# Altium footprint library Miscellaneous THD.PcbLib: 216 footprints (part 4 of 15) (continued)
## FCT_FDT37SG2M [mm] "Dual Stacked  Right Angled D-SUB 37 Pins Female Connector, With Threaded Insert UNC 4-40, And PCB Mount Retention"
height 31.5
pads (78):
  round 3.9 hole 3.2: 75(-31.75,-3.06) 75(-31.75,4.89) 76(31.75,-3.06) 76(31.75,4.89)
  round 1.7 hole 1: L1(-24.84,1.91) L2(-22.1,1.91) L3(-19.33,1.91) L4(-16.56,1.91) L5(-13.82,1.91) L6(-11.05,1.91) L7(-8.28,1.91) L8(-5.54,1.91) L9(-2.773,1.91) L10(0,1.91) L11(2.77,1.91) L12(5.54,1.91) L13(8.28,1.91) L14(11.05,1.91) L15(13.82,1.91) L16(16.56,1.91) L17(19.33,1.91) L18(22.1,1.91) L19(24.84,1.91) L20(-23.47,4.75) L21(-20.7,4.75) L22(-17.96,4.75) L23(-15.19,4.75) L24(-12.42,4.75) L25(-9.68,4.75) L26(-6.91,4.75) L27(-4.14,4.75) L28(-1.4,4.75) L29(1.4,4.75) L30(4.14,4.75) L31(6.91,4.75) L32(9.68,4.75) L33(12.42,4.75) L34(15.19,4.75) L35(17.96,4.75) L36(20.7,4.75) L37(23.47,4.75) U1(-24.84,-4.75) U2(-22.1,-4.75) U3(-19.33,-4.75) U4(-16.56,-4.75) U5(-13.82,-4.75) U6(-11.05,-4.75) U7(-8.28,-4.75) U8(-5.54,-4.75) U9(-2.773,-4.75) U10(0,-4.75) U11(2.77,-4.75) U12(5.54,-4.75) U13(8.28,-4.75) U14(11.05,-4.75) U15(13.82,-4.75) U16(16.56,-4.75) U17(19.33,-4.75) U18(22.1,-4.75) U19(24.84,-4.75) U20(-23.47,-1.91) U21(-20.7,-1.91) U22(-17.96,-1.91) U23(-15.19,-1.91) U24(-12.42,-1.91) U25(-9.68,-1.91) U26(-6.91,-1.91) U27(-4.14,-1.91) U28(-1.4,-1.91) U29(1.4,-1.91) U30(4.14,-1.91) U31(6.91,-1.91) U32(9.68,-1.91) U33(12.42,-1.91) U34(15.19,-1.91) U35(17.96,-1.91) U36(20.7,-1.91) U37(23.47,-1.91)
Top Overlay:
  circle w0.5: c-24.845,-7.955 r0.25
  lines w0.2: -34.65,9.99 34.65,9.99 ; -34.65,12.24 34.65,12.24 ; -34.55,7.99 34.55,7.99 ; -29.05,-6.96 -29.05,9.99 ; -27.949,12.84 ccw(c-27.949,13.34) -27.449,13.34 -27.449,18.265 cw(c-26.574,18.265) -26.574,19.14 26.572,19.14 cw(c26.572,18.265) 27.447,18.265 27.447,13.34 ccw(c27.947,13.34) 27.947,12.84 ; -3.14,-6.96 -34.65,-6.96 -34.65,12.84 34.65,12.84 34.65,-6.96 3.14,-6.96 ; 29.05,-6.96 29.05,9.99
  text "1" at -27.349,-5.287 h1.2
  text "1" at -27.349,1.373 h1.2
  text "37" at 25.016,4.238 h1.2
  text "37" at 25.016,-2.422 h1.2
  text "20" at -27.626,4.188 h1.2
  text "20" at -27.626,-2.472 h1.2
  text "19" at 26.386,-5.262 h1.2
  text "19" at 26.386,1.398 h1.2
  text "UPPER" at -2.21,-7.485 h1
  text "LOWER" at -2.425,6.335 h1
Mechanical 8:
  drawing of 316 lines, arcs and shapes, not listed
Mechanical 14:
  lines w0.1: -34.65,9.99 34.65,9.99 ; -34.65,12.24 34.65,12.24 ; -34.55,7.99 34.55,7.99 ; -29.05,-6.96 -29.05,7.99 -29.05,9.99 ; -27.949,12.84 ccw(c-27.949,13.34) -27.449,13.34 -27.449,18.265 cw(c-26.574,18.265) -26.574,19.14 26.572,19.14 cw(c26.572,18.265) 27.447,18.265 27.447,13.34 ccw(c27.947,13.34) 27.947,12.84 ; 3.14,-6.96 34.65,-6.96 34.65,12.84 -34.65,12.84 -34.65,-6.96 ; 29.05,-6.96 29.05,7.99 29.05,9.99 ; 30.684,5.09 30.684,-3.26 32.816,-3.26 32.816,5.09 ; 30.72,5.09 32.828,5.09 ; -34.65,-6.96 -3.14,-6.96 -34.65,-6.96 ; -32.816,-3.26 -32.816,5.09 -30.684,5.09 -30.684,-3.26 -32.816,-3.26
  text "1" at -27.349,-5.287 h1.2
  text "1" at -27.349,1.373 h1.2
  text "37" at 25.016,4.238 h1.2
  text "37" at 25.016,-2.422 h1.2
  text "20" at -27.626,4.188 h1.2
  text "20" at -27.626,-2.472 h1.2
  text "19" at 26.386,-5.262 h1.2
  text "19" at 26.386,1.398 h1.2
  text "UPPER" at -2.21,-7.485 h1
  text "LOWER" at -2.425,6.335 h1
3D body "FCT_FDT37SG2M.stp": height 31.7, standoff -3.5, extent -34.65,-6.96 34.65,19.14

## FISCHER_DBPC 102 A051-130 [mm] "Panel Rear Mounted Receptacle, 2 Contacts, Right-Angled for PCB, Keying Code 1, DBPC 102 Series"
height 12
pads (2):
  round 1.5 hole 0.8: 1(0,1.27) 2(0,-1.27)
Top Overlay:
  lines w0.2: -5,-12.87 5,-12.87 ; -4.5,-19.57 -4.5,-20.17 -4.1,-20.57 4.1,-20.57 4.5,-20.17 4.5,-19.57 ; -4.5,-16.57 -4.5,-14.07 ; -4.5,-12.57 -4.5,-6.57 ; -3.723,-16.57 -3.824,-16.77 ; -3.366,-16.57 -3.366,-19.312 ; -2.75,-6.07 -2.75,-4.77 2.375,-4.77 2.375,-6.07 ; -2.375,-6.07 -2.375,-4.77 ; -1.991,-16.57 -2.092,-16.77 ; -0.6,-19.57 ccw(c0,-19.57) 0.6,-19.57 ; -0.3,-4.77 -0.3,-2.328 ; -0.3,-2.985 cw(c0,0) 0.3,-2.985 ; 0.3,-4.77 0.3,-2.328 ; 1.991,-16.57 2.092,-16.77 ; 3.366,-16.57 3.366,-19.312 ; 3.723,-16.57 3.824,-16.77 ; 4.5,-16.57 4.5,-14.07 ; 4.5,-12.57 4.5,-6.57 ; -5.916,-17.751 -5,-19.312 -5,-19.483 -4.95,-19.57 4.95,-19.57 5,-19.483 5,-19.312 5.916,-17.751 ; -5.916,-17.751 -5.916,-16.77 ; -5.916,-17.751 -3.824,-17.751 ; -5.916,-16.77 -5.713,-16.57 5.713,-16.57 5.916,-16.77 ; -5.916,-16.77 -3.824,-16.77 ; -4.5,-6.57 -4,-6.07 4,-6.07 4.5,-6.57 ; -4.5,-6.57 4.5,-6.57 ; -3.824,-17.751 -3.824,-16.77 ; -3.824,-17.751 -3.366,-19.312 ; -3.366,-19.312 ccw(c-2.5,-17.211) -1.634,-19.312 -2.092,-17.751 ; -2.092,-17.751 -2.092,-16.77 ; -2.092,-17.751 2.092,-17.751 ; -2.092,-16.77 2.092,-16.77 ; 2.092,-17.751 2.092,-16.77 ; 2.092,-17.751 1.634,-19.312 ccw(c2.5,-17.211) 3.366,-19.312 ; 3.366,-19.312 3.824,-17.751 ; 3.824,-17.751 3.824,-16.77 ; 3.824,-17.751 5.916,-17.751 ; 3.824,-16.77 5.916,-16.77 ; 5.916,-17.751 5.916,-16.77 ; -5,-14.07 -5,-12.57 5,-12.57 5,-14.07 -5,-14.07
  text "1" at 3.81,0.67 h1.2
  text "2" at 3.81,-1.87 h1.2
Mechanical 8:
  circle w0.1: c0,1.27 r0.4
  circle w0.1: c0,-1.27 r0.4
  circle w0.1: c-6,-9.63 r1.1
  circle w0.1: c6,-9.63 r1.1
  lines w0.1: -7.5,-14.07 7.5,-14.07 ; -6.5,-9.63 -6,-9.63 ; -6,-10.13 -6,-9.63 ; -6,-9.13 -6,-9.63 ; -5.5,-9.63 -6,-9.63 ; -0.5,-1.27 0,-1.27 ; -0.5,1.27 0,1.27 ; 0,-1.77 0,-1.27 ; 0,-0.77 0,-1.27 ; 0,0.77 0,1.27 ; 0,1.77 0,1.27 ; 0.5,-1.27 0,-1.27 ; 0.5,1.27 0,1.27 ; 5.5,-9.63 6,-9.63 ; 6,-10.13 6,-9.63 ; 6,-9.13 6,-9.63 ; 6.5,-9.63 6,-9.63 ; -6,-11.53 cw(c-6,-9.63) -6,-7.73 6,-7.73 cw(c6,-9.63) 6,-11.53 -6,-11.53
  text "FP" at 5.45,-15.875 h1
Mechanical 14:
  lines w0.1: -5,-12.87 5,-12.87 ; -4.5,-19.57 -4.5,-20.17 -4.1,-20.57 4.1,-20.57 4.5,-20.17 4.5,-19.57 ; -4.5,-16.57 -4.5,-14.07 ; -4.5,-12.57 -4.5,-6.57 ; -3.723,-16.57 -3.824,-16.77 ; -3.366,-16.57 -3.366,-19.312 ; -2.75,-6.07 -2.75,-4.77 2.375,-4.77 2.375,-6.07 ; -2.375,-6.07 -2.375,-4.77 ; -1.991,-16.57 -2.092,-16.77 ; -0.6,-19.57 ccw(c0,-19.57) 0.6,-19.57 ; -0.3,-4.77 -0.3,1.27 cw(c0,1.27) 0.3,1.27 0.3,-4.77 ; -0.3,-2.985 cw(c0,0) 0.3,-2.985 ; 1.991,-16.57 2.092,-16.77 ; 3.366,-16.57 3.366,-19.312 ; 3.723,-16.57 3.824,-16.77 ; 4.5,-16.57 4.5,-14.07 ; 4.5,-12.57 4.5,-6.57 ; -5.916,-17.751 -5,-19.312 -5,-19.483 -4.95,-19.57 4.95,-19.57 5,-19.483 5,-19.312 5.916,-17.751 ; -5.916,-17.751 -5.916,-16.77 ; -5.916,-17.751 -3.824,-17.751 ; -5.916,-16.77 -5.713,-16.57 5.713,-16.57 5.916,-16.77 ; -5.916,-16.77 -3.824,-16.77 ; -4.5,-6.57 -4,-6.07 4,-6.07 4.5,-6.57 ; -4.5,-6.57 4.5,-6.57 ; -3.824,-17.751 -3.824,-16.77 ; -3.824,-17.751 -3.366,-19.312 ; -3.366,-19.312 ccw(c-2.5,-17.211) -1.634,-19.312 -2.092,-17.751 ; -2.092,-17.751 -2.092,-16.77 ; -2.092,-17.751 2.092,-17.751 ; -2.092,-16.77 2.092,-16.77 ; 2.092,-17.751 2.092,-16.77 ; 2.092,-17.751 1.634,-19.312 ccw(c2.5,-17.211) 3.366,-19.312 ; 3.366,-19.312 3.824,-17.751 ; 3.824,-17.751 3.824,-16.77 ; 3.824,-17.751 5.916,-17.751 ; 3.824,-16.77 5.916,-16.77 ; 5.916,-17.751 5.916,-16.77 ; -5,-14.07 -5,-12.57 5,-12.57 5,-14.07 -5,-14.07
  text "1" at 3.81,0.67 h1.2
  text "2" at 3.81,-1.87 h1.2
3D body "FISCHER_DBPC 102_nut.stp": height 11.96, standoff 0.04, extent -5.916,-19.57 5.916,-16.57
3D body "FISCHER_DBPC 102 A051-130.stp": height 11.45, standoff -3.1, extent -5,-20.57 5,3

## FISCHER_DBPC 102 A051-130_a [mm] "Panel Rear Mounted Receptacle, 2 Contacts, Straight for PCB, Keying Code 1, DBPC 102 Series"
height 21.5
pads (2):
  round 1.5 hole 0.8: 1(0,1.1) 2(0,-1.1)
Top Overlay:
  circle w0.2: c0,0 r3.535
  circle w0.35: c0,4.425 r0.1
  circle w0.2: c0,0 r4.95
  lines w0.2: -3.545,-4.14 ccw(c0,0) -1.813,-5.14 ; -3.545,4.14 cw(c0,0) -1.813,5.14 ; -0.055,-2.624 -0.055,-2.252 cw(c0,0) -0.055,2.252 -0.055,2.624 ; -0.055,-2.438 cw(c0,0) -0.055,2.438 ; 1.548,-2.12 cw(c0,0) 2.512,-0.764 ; 1.813,-5.14 ccw(c0,0) 3.545,-4.14 ; 1.813,5.14 cw(c0,0) 3.545,4.14 ; -5.916,-1 ccw(c0,0) -3.824,-4.623 -3.366,-3.83 -1.634,-4.83 -2.092,-5.623 ccw(c0,0) 2.092,-5.623 1.634,-4.83 3.366,-3.83 3.824,-4.623 ccw(c0,0) 5.916,-1 5,-1 5,1 5.916,1 ccw(c0,0) 3.824,4.623 3.366,3.83 1.634,4.83 2.092,5.623 ccw(c0,0) -2.092,5.623 -1.634,4.83 -3.366,3.83 -3.824,4.623 ccw(c0,0) -5.916,1 -5,1 -5,-1 -5.916,-1 ; -2.201,-3.925 cw(c0,0) -2.201,3.925 2.201,3.925 cw(c0,0) 2.201,-3.925 -2.201,-3.925
  text "2" at 1.25,-1.6 h1
  text "1" at 1.25,0.6 h1
Mechanical 8:
  lines w0.1: -0.5,-1.1 0,-1.1 ; -0.5,1.1 0,1.1 ; 0,-1.6 0,-1.1 ; 0,-0.6 0,-1.1 ; 0,0.6 0,1.1 ; 0,1.6 0,1.1 ; 0.5,-1.1 0,-1.1 ; 0.5,1.1 0,1.1
Mechanical 14:
  circle w0.1: c0,0 r2.625
  circle w0.1: c0,1.1 r0.8
  circle w0.1: c0,-1.1 r0.8
  circle w0.1: c0,-1.1 r0.3
  circle w0.1: c0,1.1 r0.3
  circle w0.1: c0,0 r3.535
  circle w0.35: c0,4.425 r0.1
  circle w0.1: c0,0 r4.95
  lines w0.1: -3.545,-4.14 ccw(c0,0) -1.813,-5.14 ; -3.545,4.14 cw(c0,0) -1.813,5.14 ; -0.062,-2.551 cw(c0,0) -0.062,2.551 ; -0.06,-2.451 cw(c0,0) -0.06,2.451 ; -0.057,-2.352 cw(c0,0) -0.057,2.352 ; -0.055,-2.624 -0.055,-2.252 cw(c0,0) -0.055,2.252 -0.055,2.624 ; 1.813,-5.14 ccw(c0,0) 3.545,-4.14 ; 1.813,5.14 cw(c0,0) 3.545,4.14 ; -5.916,-1 ccw(c0,0) -3.824,-4.623 -3.366,-3.83 -1.634,-4.83 -2.092,-5.623 ccw(c0,0) 2.092,-5.623 1.634,-4.83 3.366,-3.83 3.824,-4.623 ccw(c0,0) 5.916,-1 5,-1 5,1 5.916,1 ccw(c0,0) 3.824,4.623 3.366,3.83 1.634,4.83 2.092,5.623 ccw(c0,0) -2.092,5.623 -1.634,4.83 -3.366,3.83 -3.824,4.623 ccw(c0,0) -5.916,1 -5,1 -5,-1 -5.916,-1 ; -2.201,-3.925 cw(c0,0) -2.201,3.925 2.201,3.925 cw(c0,0) 2.201,-3.925 -2.201,-3.925
3D body "FISCHER_DBPC 102 A051-130_a.stp": height 21.5, standoff -3.1, extent -5,-5.45 5,5.45
3D body "FISCHER_DBPC 102_nut.stp": height 20.5, standoff 17.5, extent -5.916,-5.958 5.916,5.958

## FISCHER_DBPC 102 A051-230 [mm] "Panel Rear Mounted Receptacle, 2 Contacts, Right-Angled for PCB, Keying Code 2, DBPC 102 Series"
height 12
pads (2):
  round 1.5 hole 0.8: 1(0,1.27) 2(0,-1.27)
Top Overlay:
  lines w0.2: -5,-12.87 5,-12.87 ; -4.5,-19.57 -4.5,-20.17 -4.1,-20.57 4.1,-20.57 4.5,-20.17 4.5,-19.57 ; -4.5,-16.57 -4.5,-14.07 ; -4.5,-12.57 -4.5,-6.57 ; -3.723,-16.57 -3.824,-16.77 ; -3.366,-16.57 -3.366,-19.312 ; -2.75,-6.07 -2.75,-4.77 2.375,-4.77 2.375,-6.07 ; -2.375,-6.07 -2.375,-4.77 ; -1.991,-16.57 -2.092,-16.77 ; -0.6,-19.57 ccw(c0,-19.57) 0.6,-19.57 ; -0.3,-4.77 -0.3,-2.328 ; -0.3,-2.985 cw(c0,0) 0.3,-2.985 ; 0.3,-4.77 0.3,-2.328 ; 1.991,-16.57 2.092,-16.77 ; 3.366,-16.57 3.366,-19.312 ; 3.723,-16.57 3.824,-16.77 ; 4.5,-16.57 4.5,-14.07 ; 4.5,-12.57 4.5,-6.57 ; -5.916,-17.751 -5,-19.312 -5,-19.483 -4.95,-19.57 4.95,-19.57 5,-19.483 5,-19.312 5.916,-17.751 ; -5.916,-17.751 -5.916,-16.77 ; -5.916,-17.751 -3.824,-17.751 ; -5.916,-16.77 -5.713,-16.57 5.713,-16.57 5.916,-16.77 ; -5.916,-16.77 -3.824,-16.77 ; -4.5,-6.57 4.5,-6.57 ; -4.5,-6.57 -4,-6.07 4,-6.07 4.5,-6.57 ; -3.824,-17.751 -3.824,-16.77 ; -3.824,-17.751 -3.366,-19.312 ; -3.366,-19.312 ccw(c-2.5,-17.211) -1.634,-19.312 -2.092,-17.751 ; -2.092,-17.751 -2.092,-16.77 ; -2.092,-17.751 2.092,-17.751 ; -2.092,-16.77 2.092,-16.77 ; 2.092,-17.751 2.092,-16.77 ; 2.092,-17.751 1.634,-19.312 ccw(c2.5,-17.211) 3.366,-19.312 ; 3.366,-19.312 3.824,-17.751 ; 3.824,-17.751 3.824,-16.77 ; 3.824,-17.751 5.916,-17.751 ; 3.824,-16.77 5.916,-16.77 ; 5.916,-17.751 5.916,-16.77 ; -5,-14.07 5,-14.07 5,-12.57 -5,-12.57 -5,-14.07
  text "2" at 3.81,-1.87 h1.2
  text "1" at 3.81,0.67 h1.2
Mechanical 8:
  circle w0.1: c6,-9.63 r1.1
  circle w0.1: c-6,-9.63 r1.1
  circle w0.1: c0,-1.27 r0.4
  circle w0.1: c0,1.27 r0.4
  lines w0.1: -7.5,-14.07 7.5,-14.07 ; -6.5,-9.63 -6,-9.63 ; -6,-10.13 -6,-9.63 ; -6,-9.13 -6,-9.63 ; -5.5,-9.63 -6,-9.63 ; -0.5,-1.27 0,-1.27 ; -0.5,1.27 0,1.27 ; 0,-1.77 0,-1.27 ; 0,-0.77 0,-1.27 ; 0,0.77 0,1.27 ; 0,1.77 0,1.27 ; 0.5,-1.27 0,-1.27 ; 0.5,1.27 0,1.27 ; 5.5,-9.63 6,-9.63 ; 6,-10.13 6,-9.63 ; 6,-9.13 6,-9.63 ; 6.5,-9.63 6,-9.63 ; -6,-11.53 cw(c-6,-9.63) -6,-7.73 6,-7.73 cw(c6,-9.63) 6,-11.53 -6,-11.53
  text "FP" at 5.45,-15.875 h1
Mechanical 14:
  lines w0.1: -5,-12.87 5,-12.87 ; -4.5,-19.57 -4.5,-20.17 -4.1,-20.57 4.1,-20.57 4.5,-20.17 4.5,-19.57 ; -4.5,-16.57 -4.5,-14.07 ; -4.5,-12.57 -4.5,-6.57 ; -3.723,-16.57 -3.824,-16.77 ; -3.366,-16.57 -3.366,-19.312 ; -2.75,-6.07 -2.75,-4.77 2.375,-4.77 2.375,-6.07 ; -2.375,-6.07 -2.375,-4.77 ; -1.991,-16.57 -2.092,-16.77 ; -0.6,-19.57 ccw(c0,-19.57) 0.6,-19.57 ; -0.3,-4.77 -0.3,1.27 cw(c0,1.27) 0.3,1.27 0.3,-4.77 ; -0.3,-2.985 cw(c0,0) 0.3,-2.985 ; 1.991,-16.57 2.092,-16.77 ; 3.366,-16.57 3.366,-19.312 ; 3.723,-16.57 3.824,-16.77 ; 4.5,-16.57 4.5,-14.07 ; 4.5,-12.57 4.5,-6.57 ; -5.916,-17.751 -5,-19.312 -5,-19.483 -4.95,-19.57 4.95,-19.57 5,-19.483 5,-19.312 5.916,-17.751 ; -5.916,-17.751 -5.916,-16.77 ; -5.916,-17.751 -3.824,-17.751 ; -5.916,-16.77 -5.713,-16.57 5.713,-16.57 5.916,-16.77 ; -5.916,-16.77 -3.824,-16.77 ; -4.5,-6.57 4.5,-6.57 ; -4.5,-6.57 -4,-6.07 4,-6.07 4.5,-6.57 ; -3.824,-17.751 -3.824,-16.77 ; -3.824,-17.751 -3.366,-19.312 ; -3.366,-19.312 ccw(c-2.5,-17.211) -1.634,-19.312 -2.092,-17.751 ; -2.092,-17.751 -2.092,-16.77 ; -2.092,-17.751 2.092,-17.751 ; -2.092,-16.77 2.092,-16.77 ; 2.092,-17.751 2.092,-16.77 ; 2.092,-17.751 1.634,-19.312 ccw(c2.5,-17.211) 3.366,-19.312 ; 3.366,-19.312 3.824,-17.751 ; 3.824,-17.751 3.824,-16.77 ; 3.824,-17.751 5.916,-17.751 ; 3.824,-16.77 5.916,-16.77 ; 5.916,-17.751 5.916,-16.77 ; -5,-14.07 5,-14.07 5,-12.57 -5,-12.57 -5,-14.07
  text "2" at 3.81,-1.87 h1.2
  text "1" at 3.81,0.67 h1.2
3D body "FISCHER_DBPC 102 A051-230.stp": height 11.45, standoff -3.1, extent -5,-20.57 5,3
3D body "FISCHER_DBPC 102_nut.stp": height 11.96, standoff 0.04, extent -5.916,-19.57 5.916,-16.57

## FISCHER_DBPC 102 A051-230_a [mm] "Panel Rear Mounted Receptacle, 2 Contacts, Straight for PCB, Keying Code 2, DBPC 102 Series"
height 21.5
pads (2):
  round 1.5 hole 0.8: 1(0,1.1) 2(0,-1.1)
Top Overlay:
  circle w0.2: c0,0 r3.535
  circle w0.35: c0,4.425 r0.1
  circle w0.2: c0,0 r4.95
  lines w0.2: -3.545,-4.14 ccw(c0,0) -1.813,-5.14 ; -3.545,4.14 cw(c0,0) -1.813,5.14 ; -1.856,-1.856 -1.591,-1.591 ccw(c0,0) 0.877,-2.072 ; -1.856,1.856 -1.591,1.591 cw(c0,0) 0.879,2.071 ; -1.732,-1.732 ccw(c0,0) 1.286,-2.085 ; -1.732,1.732 cw(c0,0) 1.283,2.087 ; 0.877,-2.067 1.618,-2.067 cw(c0,0) 2.485,-0.845 ; 0.877,2.067 1.618,2.067 ; 1.813,-5.14 ccw(c0,0) 3.545,-4.14 ; 1.813,5.14 cw(c0,0) 3.545,4.14 ; -5.916,-1 ccw(c0,0) -3.824,-4.623 -3.366,-3.83 -1.634,-4.83 -2.092,-5.623 ccw(c0,0) 2.092,-5.623 1.634,-4.83 3.366,-3.83 3.824,-4.623 ccw(c0,0) 5.916,-1 5,-1 5,1 5.916,1 ccw(c0,0) 3.824,4.623 3.366,3.83 1.634,4.83 2.092,5.623 ccw(c0,0) -2.092,5.623 -1.634,4.83 -3.366,3.83 -3.824,4.623 ccw(c0,0) -5.916,1 -5,1 -5,-1 -5.916,-1 ; -2.201,-3.925 cw(c0,0) -2.201,3.925 2.201,3.925 cw(c0,0) 2.201,-3.925 -2.201,-3.925
  text "1" at 1.25,0.6 h1
  text "2" at 1.25,-1.6 h1
Mechanical 8:
  lines w0.1: -0.5,-1.1 0,-1.1 ; -0.5,1.1 0,1.1 ; 0,-1.6 0,-1.1 ; 0,-0.6 0,-1.1 ; 0,0.6 0,1.1 ; 0,1.6 0,1.1 ; 0.5,-1.1 0,-1.1 ; 0.5,1.1 0,1.1
Mechanical 14:
  circle w0.1: c0,0 r2.625
  circle w0.1: c0,1.1 r0.8
  circle w0.1: c0,-1.1 r0.8
  circle w0.1: c0,-1.1 r0.3
  circle w0.1: c0,1.1 r0.3
  circle w0.1: c0,0 r3.535
  circle w0.35: c0,4.425 r0.1
  circle w0.1: c0,0 r4.95
  lines w0.1: -3.545,-4.14 ccw(c0,0) -1.813,-5.14 ; -3.545,4.14 cw(c0,0) -1.813,5.14 ; -1.856,-1.856 -1.591,-1.591 ccw(c0,0) 1.591,-1.591 1.856,-1.856 ; -1.856,1.856 -1.591,1.591 cw(c0,0) 1.591,1.591 1.856,1.856 ; -1.803,-1.803 ccw(c0,0) 1.803,-1.803 ; -1.803,1.803 cw(c0,0) 1.803,1.803 ; -1.732,-1.732 ccw(c0,0) 1.732,-1.732 ; -1.732,1.732 cw(c0,0) 1.732,1.732 ; -1.662,-1.662 ccw(c0,0) 1.662,-1.662 ; -1.662,1.662 cw(c0,0) 1.662,1.662 ; 1.813,-5.14 ccw(c0,0) 3.545,-4.14 ; 1.813,5.14 cw(c0,0) 3.545,4.14 ; -5.916,-1 ccw(c0,0) -3.824,-4.623 -3.366,-3.83 -1.634,-4.83 -2.092,-5.623 ccw(c0,0) 2.092,-5.623 1.634,-4.83 3.366,-3.83 3.824,-4.623 ccw(c0,0) 5.916,-1 5,-1 5,1 5.916,1 ccw(c0,0) 3.824,4.623 3.366,3.83 1.634,4.83 2.092,5.623 ccw(c0,0) -2.092,5.623 -1.634,4.83 -3.366,3.83 -3.824,4.623 ccw(c0,0) -5.916,1 -5,1 -5,-1 -5.916,-1 ; -2.201,-3.925 cw(c0,0) -2.201,3.925 2.201,3.925 cw(c0,0) 2.201,-3.925 -2.201,-3.925
3D body "FISCHER_DBPC 102 A051-230_a.stp": height 21.5, standoff -3.1, extent -5,-5.45 5,5.45
3D body "FISCHER_DBPC 102_nut.stp": height 20.5, standoff 17.5, extent -5.916,-5.958 5.916,5.958

## FISCHER_DBPC 102 A053-130 [mm] "Panel Rear Mounted Receptacle, 4 Contacts, Right-Angled for PCB, Keying Code 1, DBPC 102 Series"
height 12
pads (4):
  round 1.4 hole 0.7: 1(0.92,1.24) 2(-0.92,1.24) 3(-0.92,-1.3) 4(0.92,-1.3)
Top Overlay:
  lines w0.2: -5,-11.4 5,-11.4 ; -4.5,-18.1 -4.5,-18.7 -4.1,-19.1 4.1,-19.1 4.5,-18.7 4.5,-18.1 ; -4.5,-15.1 -4.5,-12.6 ; -4.5,-11.1 -4.5,-5.1 ; -3.723,-15.1 -3.824,-15.3 ; -3.366,-15.1 -3.366,-17.842 ; -2.75,-4.6 -2.75,-3.3 2.375,-3.3 2.375,-4.6 ; -2.375,-4.6 -2.375,-3.3 ; -1.991,-15.1 -2.092,-15.3 ; -1.22,-3.3 -1.22,-2.358 ; -1.22,-2.771 cw(c0,-0.03) 1.22,-2.771 ; -0.62,-3.3 -0.62,-2.358 ; -0.62,-2.965 ccw(c0,-0.03) 0.62,-2.965 ; -0.6,-18.1 ccw(c0,-18.1) 0.6,-18.1 ; 0.62,-3.3 0.62,-2.358 ; 1.22,-3.3 1.22,-2.358 ; 1.991,-15.1 2.092,-15.3 ; 3.366,-15.1 3.366,-17.842 ; 3.723,-15.1 3.824,-15.3 ; 4.5,-15.1 4.5,-12.6 ; 4.5,-11.1 4.5,-5.1 ; -5.916,-16.281 -3.824,-16.281 ; -5.916,-16.281 -5.916,-15.3 ; -5.916,-16.281 -5,-17.842 -5,-18.013 -4.95,-18.1 4.95,-18.1 5,-18.013 5,-17.842 5.916,-16.281 ; -5.916,-15.3 -3.824,-15.3 ; -5.916,-15.3 -5.713,-15.1 5.713,-15.1 5.916,-15.3 ; -4.5,-5.1 -4,-4.6 4,-4.6 4.5,-5.1 ; -4.5,-5.1 4.5,-5.1 ; -3.824,-16.281 -3.366,-17.842 ; -3.824,-16.281 -3.824,-15.3 ; -3.366,-17.842 ccw(c-2.5,-15.741) -1.634,-17.842 -2.092,-16.281 ; -2.092,-16.281 2.092,-16.281 ; -2.092,-16.281 -2.092,-15.3 ; -2.092,-15.3 2.092,-15.3 ; 2.092,-16.281 1.634,-17.842 ccw(c2.5,-15.741) 3.366,-17.842 ; 2.092,-16.281 2.092,-15.3 ; 3.366,-17.842 3.824,-16.281 ; 3.824,-16.281 5.916,-16.281 ; 3.824,-16.281 3.824,-15.3 ; 3.824,-15.3 5.916,-15.3 ; 5.916,-16.281 5.916,-15.3 ; -5,-12.6 -5,-11.1 5,-11.1 5,-12.6 -5,-12.6
  text "1" at 3.5,0.7 h1.2
  text "2" at -4.4,0.7 h1.2
  text "3" at -4.4,-1.9 h1.2
  text "4" at 3.3,-1.9 h1.2
Mechanical 8:
  circle w0.1: c-6,-9.2 r1.1
  circle w0.1: c6,-9.2 r1.1
  lines w0.1: -7.5,-12.6 7.5,-12.6 ; -6.5,-9.2 -6,-9.2 ; -6,-9.7 -6,-9.2 ; -6,-8.7 -6,-9.2 ; -5.5,-9.2 -6,-9.2 ; -1.42,-1.3 -0.92,-1.3 -0.92,-1.8 ; -1.42,1.24 -0.92,1.24 -0.92,0.74 ; -0.5,-0.03 0,-0.03 ; 0,-0.53 0,-0.03 ; 0,0.47 0,-0.03 ; 0.42,-1.3 0.92,-1.3 0.92,-1.8 ; 0.42,1.24 0.92,1.24 0.92,0.74 ; 0.5,-0.03 0,-0.03 ; 5.5,-9.2 6,-9.2 ; 6,-9.7 6,-9.2 ; 6,-8.7 6,-9.2 ; 6.5,-9.2 6,-9.2 ; -6,-11.1 cw(c-6,-9.2) -6,-7.3 6,-7.3 cw(c6,-9.2) 6,-11.1 -6,-11.1
  text "FP" at 5.45,-14.405 h1
Mechanical 14:
  lines w0.1: -5,-11.4 5,-11.4 ; -4.5,-18.1 -4.5,-18.7 -4.1,-19.1 4.1,-19.1 4.5,-18.7 4.5,-18.1 ; -4.5,-15.1 -4.5,-12.6 ; -4.5,-11.1 -4.5,-5.1 ; -3.723,-15.1 -3.824,-15.3 ; -3.366,-15.1 -3.366,-17.842 ; -2.75,-4.6 -2.75,-3.3 2.375,-3.3 2.375,-4.6 ; -2.375,-4.6 -2.375,-3.3 ; -1.991,-15.1 -2.092,-15.3 ; -1.22,-3.3 -1.22,1.24 cw(c-0.92,1.24) -0.62,1.24 -0.62,-3.3 ; -1.22,-2.771 cw(c0,-0.03) 1.22,-2.771 ; -0.62,-2.965 ccw(c0,-0.03) 0.62,-2.965 ; -0.6,-18.1 ccw(c0,-18.1) 0.6,-18.1 ; 0.62,-3.3 0.62,1.24 cw(c0.92,1.24) 1.22,1.24 1.22,-3.3 ; 1.991,-15.1 2.092,-15.3 ; 3.366,-15.1 3.366,-17.842 ; 3.723,-15.1 3.824,-15.3 ; 4.5,-15.1 4.5,-12.6 ; 4.5,-11.1 4.5,-5.1 ; -5.916,-16.281 -3.824,-16.281 ; -5.916,-16.281 -5.916,-15.3 ; -5.916,-16.281 -5,-17.842 -5,-18.013 -4.95,-18.1 4.95,-18.1 5,-18.013 5,-17.842 5.916,-16.281 ; -5.916,-15.3 -3.824,-15.3 ; -5.916,-15.3 -5.713,-15.1 5.713,-15.1 5.916,-15.3 ; -4.5,-5.1 -4,-4.6 4,-4.6 4.5,-5.1 ; -4.5,-5.1 4.5,-5.1 ; -3.824,-16.281 -3.366,-17.842 ; -3.824,-16.281 -3.824,-15.3 ; -3.366,-17.842 ccw(c-2.5,-15.741) -1.634,-17.842 -2.092,-16.281 ; -2.092,-16.281 2.092,-16.281 ; -2.092,-16.281 -2.092,-15.3 ; -2.092,-15.3 2.092,-15.3 ; 2.092,-16.281 1.634,-17.842 ccw(c2.5,-15.741) 3.366,-17.842 ; 2.092,-16.281 2.092,-15.3 ; 3.366,-17.842 3.824,-16.281 ; 3.824,-16.281 5.916,-16.281 ; 3.824,-16.281 3.824,-15.3 ; 3.824,-15.3 5.916,-15.3 ; 5.916,-16.281 5.916,-15.3 ; -5,-12.6 -5,-11.1 5,-11.1 5,-12.6 -5,-12.6
3D body "FISCHER_DBPC 102 A053-130.stp": height 11.98, standoff -3.1, extent -5.916,-19.1 5.916,2.97
3D body "FISCHER_DBPC 102_nut.stp": height 11.96, standoff 0.04, extent -5.916,-18.1 5.916,-15.1

## FISCHER_DBPC 102 A053-130_a [mm] "Panel Rear Mounted Receptacle, 4 Contacts, Straight for PCB, Keying Code 1, DBPC 102 Series"
height 21.5
pads (4):
  round 1.5 hole 0.8: 1(0.919,0.919) 2(-0.919,0.919) 3(-0.919,-0.919) 4(0.919,-0.919)
Top Overlay:
  circle w0.35: c0,4.425 r0.1
  circle w0.2: c0,0 r4.95
  lines w0.2: -3.545,-4.14 ccw(c0,0) -1.813,-5.14 ; -3.545,4.14 cw(c0,0) -1.813,5.14 ; -2.5,-2.5 ccw(c0,0) 2.5,-2.5 ; -2.5,2.5 cw(c0,0) 2.5,2.5 ; -1.109,-2.379 ccw(c0,0) 1.856,-1.856 ; -1.109,2.379 cw(c0,0) 1.856,1.856 ; -1.031,-2.21 ccw(c0,0) -0.055,-2.438 ; -1.031,2.21 cw(c0,0) -0.055,2.438 ; -0.952,-2.041 ccw(c0,0) -0.055,-2.252 -0.055,-2.624 ; -0.952,2.041 cw(c0,0) -0.055,2.252 -0.055,2.624 ; 1.813,-5.14 ccw(c0,0) 3.545,-4.14 ; 1.813,5.14 cw(c0,0) 3.545,4.14 ; -5.916,-1 ccw(c0,0) -3.824,-4.623 -3.366,-3.83 -1.634,-4.83 -2.092,-5.623 ccw(c0,0) 2.092,-5.623 1.634,-4.83 3.366,-3.83 3.824,-4.623 ccw(c0,0) 5.916,-1 5,-1 5,1 5.916,1 ccw(c0,0) 3.824,4.623 3.366,3.83 1.634,4.83 2.092,5.623 ccw(c0,0) -2.092,5.623 -1.634,4.83 -3.366,3.83 -3.824,4.623 ccw(c0,0) -5.916,1 -5,1 -5,-1 -5.916,-1 ; -2.201,-3.925 cw(c0,0) -2.201,3.925 2.201,3.925 cw(c0,0) 2.201,-3.925 -2.201,-3.925
  text "4" at 2.1,-1.6 h1.2
  text "3" at -3.1,-1.6 h1.2
  text "2" at -3.1,0.4 h1.2
  text "1" at 2.3,0.4 h1.2
Mechanical 8:
  circle w0.1: c0,0 r1.3
  lines w0.1: -1.419,-0.919 -0.919,-0.919 ; -1.419,0.919 -0.919,0.919 ; -0.919,-1.419 -0.919,-0.919 ; -0.919,0.419 -0.919,0.919 ; 0.419,-0.919 0.919,-0.919 ; 0.419,0.919 0.919,0.919 ; 0.919,-1.419 0.919,-0.919 ; 0.919,0.419 0.919,0.919 ; -0.919,-0.919 0.919,0.919 ; -0.919,0.919 0.919,-0.919
Mechanical 14:
  circle w0.1: c-0.919,0.919 r0.3
  circle w0.1: c-0.919,0.919 r0.8
  circle w0.1: c0.919,0.919 r0.3
  circle w0.1: c0.919,0.919 r0.8
  circle w0.1: c0.919,-0.919 r0.3
  circle w0.1: c0.919,-0.919 r0.8
  circle w0.1: c-0.919,-0.919 r0.3
  circle w0.1: c-0.919,-0.919 r0.8
  circle w0.1: c0,0 r2.625
  circle w0.1: c0,0 r3.535
  circle w0.35: c0,4.425 r0.1
  circle w0.1: c0,0 r4.95
  lines w0.1: -3.545,-4.14 ccw(c0,0) -1.813,-5.14 ; -3.545,4.14 cw(c0,0) -1.813,5.14 ; -0.062,-2.551 cw(c0,0) -0.062,2.551 ; -0.06,-2.451 cw(c0,0) -0.06,2.451 ; -0.057,-2.352 cw(c0,0) -0.057,2.352 ; -0.055,-2.624 -0.055,-2.252 cw(c0,0) -0.055,2.252 -0.055,2.624 ; 1.813,-5.14 ccw(c0,0) 3.545,-4.14 ; 1.813,5.14 cw(c0,0) 3.545,4.14 ; -5.916,-1 ccw(c0,0) -3.824,-4.623 -3.366,-3.83 -1.634,-4.83 -2.092,-5.623 ccw(c0,0) 2.092,-5.623 1.634,-4.83 3.366,-3.83 3.824,-4.623 ccw(c0,0) 5.916,-1 5,-1 5,1 5.916,1 ccw(c0,0) 3.824,4.623 3.366,3.83 1.634,4.83 2.092,5.623 ccw(c0,0) -2.092,5.623 -1.634,4.83 -3.366,3.83 -3.824,4.623 ccw(c0,0) -5.916,1 -5,1 -5,-1 -5.916,-1 ; -2.201,-3.925 cw(c0,0) -2.201,3.925 2.201,3.925 cw(c0,0) 2.201,-3.925 -2.201,-3.925
3D body "FISCHER_DBPC 102 A053-130_a.stp": height 21.5, standoff -3.1, extent -5,-5.45 5,5.45
3D body "FISCHER_DBPC 102_nut.stp": height 20.5, standoff 17.5, extent -5.916,-5.958 5.916,5.958

## FISCHER_DBPC 103 A051-130_a [mm] "Panel Rear Mounted Receptacle, 2 Contacts, Straight for PCB, Keying Code 1, DBPC 103 Series"
height 23
pads (2):
  round 1.7 hole 1: 1(0,1.5) 2(0,-1.5)
Top Overlay:
  circle w0.2: c0,0 r6.45
  circle w0.2: c0,0 r4.8
  circle w0.2: c0,0 r3.475
  circle w0.35: c0,5.6 r0.1
  lines w0.2: -0.025,-3.475 -0.025,-3.1 cw(c0,0) -0.026,3.1 -0.025,3.475 ; -0.026,-3.337 cw(c0,0) -0.026,3.337 ; -0.025,-3.237 cw(c0,0) -0.025,3.237 ; 1.291,-2.485 cw(c0,0) 1.299,2.481 ; 2.03,1.928 cw(c0,0) 2.698,0.75 2.5,0.75 2.5,-0.75 2.698,-0.75 cw(c0,0) 2.302,-1.594 ; -7.029,-2.615 cw(c0,0) -7.029,2.615 -6.254,2.167 -5.004,4.333 -5.779,4.78 cw(c0,0) -1.25,7.395 -1.25,6.5 1.25,6.5 1.25,7.395 cw(c0,0) 5.779,4.78 5.004,4.333 6.254,2.167 7.029,2.615 cw(c0,0) 7.029,-2.615 6.254,-2.167 5.004,-4.333 5.779,-4.78 cw(c0,0) 1.25,-7.395 1.25,-6.5 -1.25,-6.5 -1.25,-7.395 cw(c0,0) -5.779,-4.78 -5.004,-4.333 -6.254,-2.167 -7.029,-2.615 ; -3.161,5.1 ccw(c0,0) 3.161,5.1 -3.161,5.1
  text "1" at 1.25,1 h1
  text "2" at 1.25,-2 h1
Mechanical 8:
  lines w0.1: -0.5,-1.5 0,-1.5 ; -0.5,1.5 0,1.5 ; 0,-2 0,-1.5 ; 0,-1 0,-1.5 ; 0,1 0,1.5 ; 0,2 0,1.5 ; 0.5,-1.5 0,-1.5 ; 0.5,1.5 0,1.5
Mechanical 14:
  circle w0.1: c0,0 r6.45
  circle w0.1: c0,0 r4.8
  circle w0.1: c0,0 r3.475
  circle w0.1: c0,-1.5 r1.1
  circle w0.1: c0,1.5 r1.1
  circle w0.1: c0,-1.5 r0.4
  circle w0.1: c0,1.5 r0.4
  circle w0.35: c0,5.6 r0.1
  lines w0.1: -0.025,-3.475 -0.025,-3.1 cw(c0,0) -0.026,3.1 -0.025,3.475 ; -7.029,-2.615 cw(c0,0) -7.029,2.615 -6.254,2.167 -5.004,4.333 -5.779,4.78 cw(c0,0) -1.25,7.395 -1.25,6.5 1.25,6.5 1.25,7.395 cw(c0,0) 5.779,4.78 5.004,4.333 6.254,2.167 7.029,2.615 cw(c0,0) 7.029,-2.615 6.254,-2.167 5.004,-4.333 5.779,-4.78 cw(c0,0) 1.25,-7.395 1.25,-6.5 -1.25,-6.5 -1.25,-7.395 cw(c0,0) -5.779,-4.78 -5.004,-4.333 -6.254,-2.167 -7.029,-2.615 ; -3.161,5.1 ccw(c0,0) 3.161,5.1 -3.161,5.1 ; 2.5,-0.75 2.698,-0.75 cw(c0,0) 2.698,0.75 2.5,0.75 2.5,-0.75
  lines w0.2: -0.1,-3.336 cw(c0,0) -0.1,3.336 ; -0.1,-3.236 cw(c0,0) -0.1,3.236
3D body "FISCHER_DBPC 103 A051-130_a.stp": height 23, standoff -3.1, extent -6.936,-6.95 6.936,6.95
3D body "FISCHER_DBPC 103_nut.stp": height 21.5, standoff 17.5, extent -7.367,-7.395 7.528,7.395

## FISCHER_DBPC 103 A051-230_a [mm] "Panel Rear Mounted Receptacle, 2 Contacts, Straight for PCB, Keying Code 2, DBPC 103 Series"
height 23
pads (2):
  round 1.7 hole 1: 1(0,1.5) 2(0,-1.5)
Top Overlay:
  circle w0.2: c0,0 r6.45
  circle w0.2: c0,0 r4.8
  circle w0.2: c0,0 r3.475
  circle w0.35: c0,5.6 r0.1
  lines w0.2: -2.457,-2.457 -2.192,-2.192 ccw(c0,0) 1.961,-2.401 2.5,-2.401 ; -2.457,2.457 -2.192,2.192 cw(c0,0) 2.192,2.192 2.457,2.457 ; -2.36,-2.36 ccw(c0,0) 2.309,-2.41 ; -2.36,2.36 cw(c0,0) 2.36,2.36 ; -2.289,-2.289 ccw(c0,0) 2.16,-2.411 ; -2.289,2.289 cw(c0,0) 2.289,2.289 ; 1.291,-2.485 cw(c0,0) 1.299,2.481 ; 2.03,1.928 cw(c0,0) 2.698,0.75 2.5,0.75 2.5,-0.75 2.698,-0.75 cw(c0,0) 2.302,-1.594 ; -7.029,-2.615 cw(c0,0) -7.029,2.615 -6.254,2.167 -5.004,4.333 -5.779,4.78 cw(c0,0) -1.25,7.395 -1.25,6.5 1.25,6.5 1.25,7.395 cw(c0,0) 5.779,4.78 5.004,4.333 6.254,2.167 7.029,2.615 cw(c0,0) 7.029,-2.615 6.254,-2.167 5.004,-4.333 5.779,-4.78 cw(c0,0) 1.25,-7.395 1.25,-6.5 -1.25,-6.5 -1.25,-7.395 cw(c0,0) -5.779,-4.78 -5.004,-4.333 -6.254,-2.167 -7.029,-2.615 ; -3.161,5.1 ccw(c0,0) 3.161,5.1 -3.161,5.1
  text "1" at 1.25,1 h1
  text "2" at 1.25,-2 h1
Mechanical 8:
  lines w0.1: -0.5,-1.5 0,-1.5 ; -0.5,1.5 0,1.5 ; 0,-2 0,-1.5 ; 0,-1 0,-1.5 ; 0,1 0,1.5 ; 0,2 0,1.5 ; 0.5,-1.5 0,-1.5 ; 0.5,1.5 0,1.5
Mechanical 14:
  circle w0.1: c0,0 r6.45
  circle w0.1: c0,0 r4.8
  circle w0.1: c0,0 r3.475
  circle w0.1: c0,-1.5 r1.1
  circle w0.1: c0,1.5 r1.1
  circle w0.1: c0,-1.5 r0.4
  circle w0.1: c0,1.5 r0.4
  circle w0.35: c0,5.6 r0.1
  lines w0.1: -2.457,-2.457 -2.192,-2.192 ccw(c0,0) 2.192,-2.192 2.457,-2.457 ; -2.457,2.457 -2.192,2.192 cw(c0,0) 2.192,2.192 2.457,2.457 ; -7.029,-2.615 cw(c0,0) -7.029,2.615 -6.254,2.167 -5.004,4.333 -5.779,4.78 cw(c0,0) -1.25,7.395 -1.25,6.5 1.25,6.5 1.25,7.395 cw(c0,0) 5.779,4.78 5.004,4.333 6.254,2.167 7.029,2.615 cw(c0,0) 7.029,-2.615 6.254,-2.167 5.004,-4.333 5.779,-4.78 cw(c0,0) 1.25,-7.395 1.25,-6.5 -1.25,-6.5 -1.25,-7.395 cw(c0,0) -5.779,-4.78 -5.004,-4.333 -6.254,-2.167 -7.029,-2.615 ; -3.161,5.1 ccw(c0,0) 3.161,5.1 -3.161,5.1 ; 2.5,-0.75 2.698,-0.75 cw(c0,0) 2.698,0.75 2.5,0.75 2.5,-0.75
  lines w0.2: -2.31,-2.409 ccw(c0,0) 2.308,-2.411 ; -2.308,2.411 cw(c0,0) 2.31,2.409 ; -2.247,-2.331 ccw(c0,0) 2.238,-2.339 ; -2.238,2.339 cw(c0,0) 2.247,2.331
3D body "FISCHER_DBPC 103 A051-230_a.stp": height 23, standoff -3.1, extent -6.936,-6.95 6.936,6.95
3D body "FISCHER_DBPC 103_nut.stp": height 21.5, standoff 17.5, extent -7.367,-7.395 7.528,7.395

## FONDEX_18713 [mm] "Solder Fork Terminal (hole 1.3 mm)"
height 4
pads (1):
  round 2.5 hole 1.3: 1(0,0)
Top Overlay:
  circle w0.2: c0,0 r1.6
Mechanical 8:
  lines w0.1: -1,0 0,0 ; 0,-1 0,0 ; 0,1 0,0 ; 1,0 0,0
Mechanical 14:
  circle w0.1: c0,0 r1.25
  lines w0.1: -0.4,-1.184 -0.4,-0.447 ccw(c0,0) 0.4,-0.447 0.4,-1.184 ; -0.4,1.184 -0.4,0.447 cw(c0,0) 0.4,0.447 0.4,1.184
3D body "FONDEX_18713.stp": height 4, standoff -2.6, extent -1.25,-1.25 1.25,1.25